# Altium footprint library THT_CON.PcbLib: 48 footprints (part 2 of 3)
Each footprint in its own frame and in the unit in brackets; x right, y up, seen from the top. Pads: shape width x height; smd on the part's side, far side on the other; paste and mask are expansions set on the pad; w line width, h text height; cw(c..) or ccw(c..) is an arc to the next point about the centre after c.
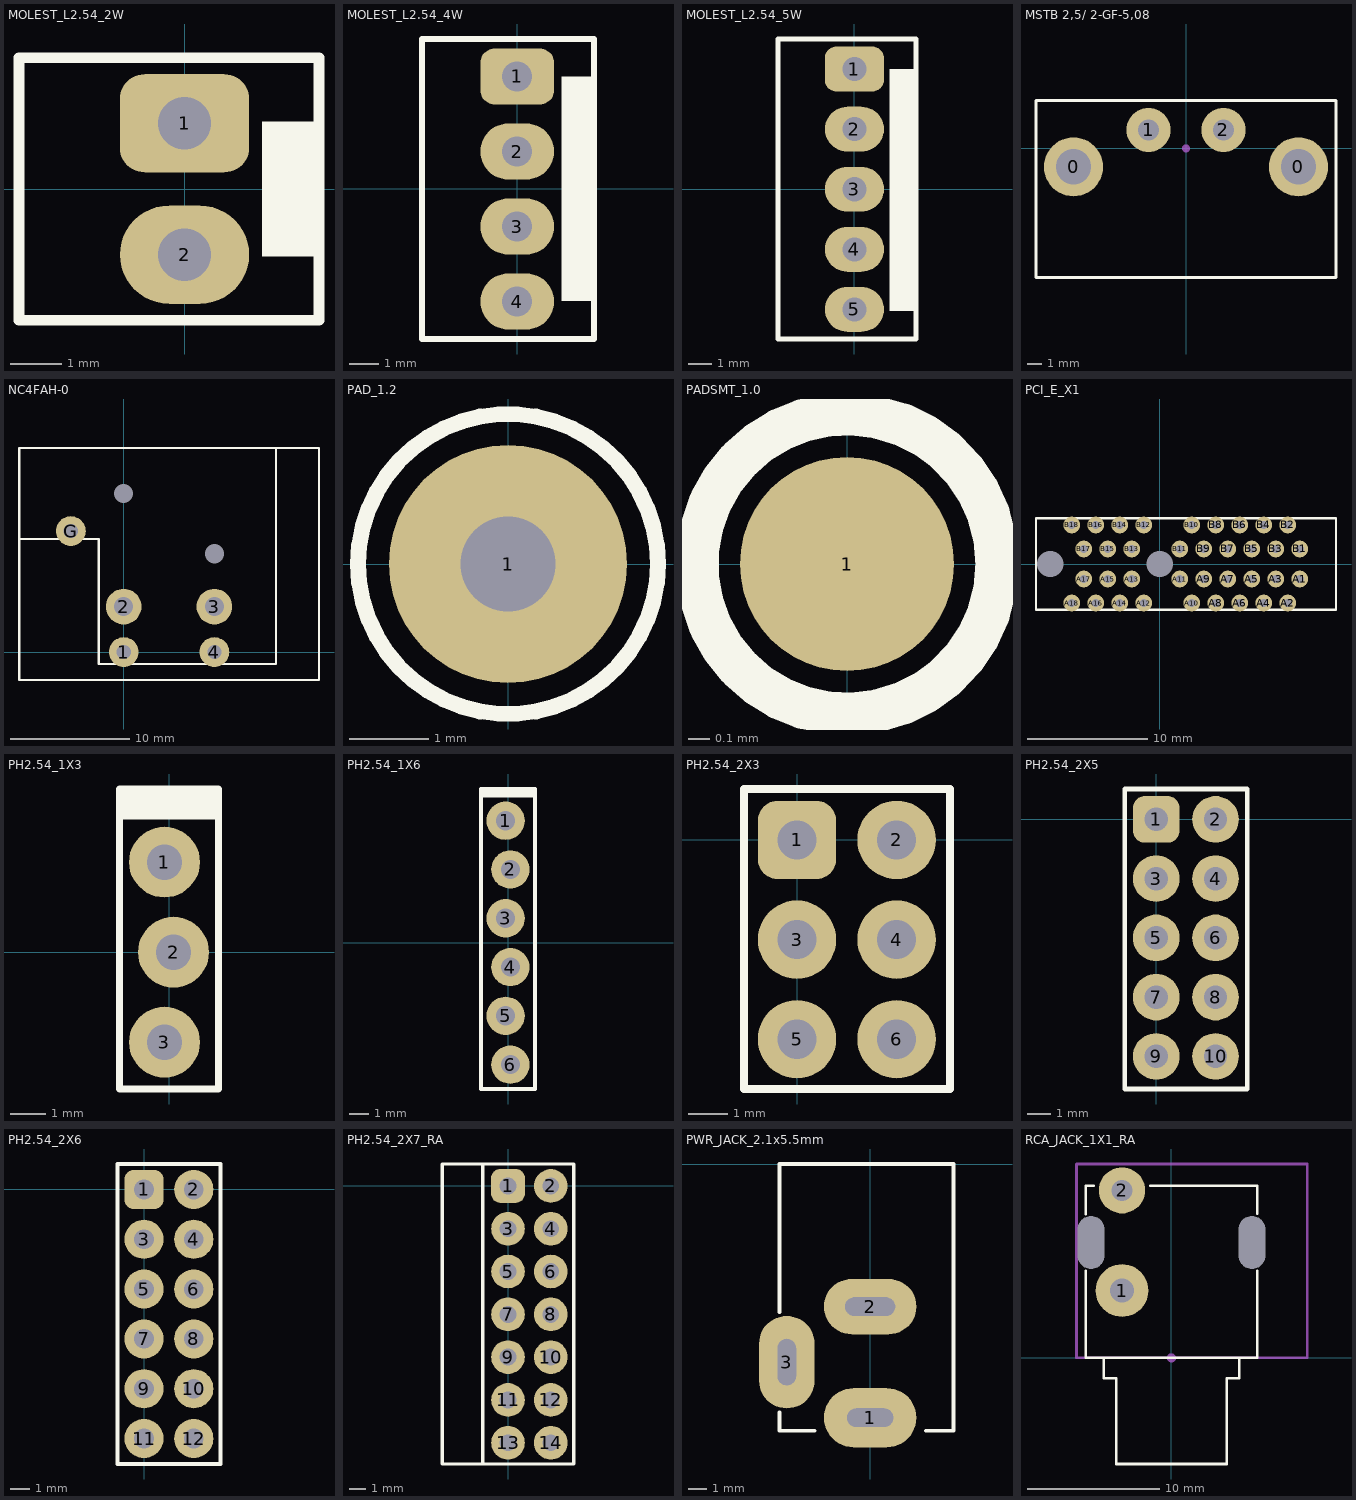
[diagram p1: the footprints below, top view; thin cyan lines are the x and y axes]

## MOLEST_L2.54_2W [mm]
pads (2):
  rrect50% 2.5x1.9 hole 1.016: 1(0,1.27)
  oval 2.5x1.9 hole 1.016: 2(0,-1.27)
Top Overlay:
  region: 2.6,1.3 1.5,1.3 1.5,-1.3 2.6,-1.3
  lines w0.203: -3.2,-2.54 -3.2,2.54 2.6,2.54 2.6,-2.54 -3.2,-2.54
3D body "molex2pin.STEP": height 11.41, standoff -3.39, extent -3.2,-2.565 2.6,2.555

## MOLEST_L2.54_4W [mm]
pads (4):
  rrect50% 2.5x1.9 hole 1.016: 1(0,3.81)
  oval 2.5x1.9 hole 1.016: 2(0,1.27) 3(0,-1.27) 4(0,-3.81)
Top Overlay:
  region: 2.6,3.81 1.5,3.81 1.5,-3.79 2.6,-3.79
  lines w0.203: 1.245,-5.08 -3.225,-5.08 -3.225,5.08 2.6,5.08 2.6,-5.08 -1.27,-5.08 1.27,-5.08
3D body "molex4pin.STEP": height 11.44, standoff -3.36, extent -3.2,-5.09 2.6,5.11

## MOLEST_L2.54_5W [mm]
pads (5):
  rrect50% 2.5x1.9 hole 1.016: 1(0,5.08)
  oval 2.5x1.9 hole 1.016: 2(0,2.54) 3(0,0) 4(0,-2.54) 5(0,-5.08)
Top Overlay:
  region: 2.6,5.08 1.5,5.08 1.5,-5.13 2.6,-5.13
  lines w0.203: -3.225,-6.33 2.6,-6.33 2.6,6.35 -3.225,6.35 -3.225,-6.33
3D body "molex4pin.STEP": height 11.44, standoff -3.36, extent -3.2,-6.36 2.6,3.84
3D body "molex4pin.STEP": height 11.44, standoff -3.36, extent -3.2,-3.82 2.6,6.38

## MSTB 2,5/ 2-GF-5,08 [mm] "Phoenix 2 pin 5.08mm"
pads (4):
  round 4 hole 2.4: 0(-7.62,-1.25) 0(7.62,-1.25)
  round 3 hole 1.4: 1(-2.54,1.25) 2(2.54,1.25)
Top Overlay:
  lines w0.2: -10.16,-8.75 10.16,-8.75 10.16,3.25 -10.16,3.25 -10.16,-8.75
Mechanical 15:
  circle w0.254: c0,0 r0.141
3D body "pxc_1776508_06_03_MSTB-2-5-2-GF-5-08_3D.stp": height 8.57, standoff -3.5, extent -10.135,-8.794 10.135,3.206

## NC4FAH-0 [mm]
pads (7):
  round 0 hole 1.6 unplated: 0(0,13.34) 0(7.62,8.26)
  round 2.5 hole 1.2: 1(0,0) 4(7.62,0) G(-4.44,10.17)
  round 3 hole 1.6: 2(0,3.815) 3(7.62,3.815)
Top Overlay:
  lines w0.2: -8.8,9.5 -2.1,9.5 -2.1,-1 12.8,-1 12.8,17.1 ; -8.79,-2.35 -8.79,17.15 16.41,17.15 16.41,-2.35 -8.79,-2.35
3D body "nc4fah-0.STEP": height 25, standoff -3.51, extent -8.69,-2.35 16.31,20.05

## PAD_1.2 [mm]
pads (1):
  round 3 hole 1.2: 1(0,0)
Top Overlay:
  circle w0.2: c0,0 r1.887

## PADSMT_1.0 [mm]
pads (1):
  round 1 smd: 1(0,0)
Top Overlay:
  circle w0.2: c0,0 r0.7

## PCI_E_X1 [mm]
pads (38):
  round 1.4 / inner round 1.1 / far side round 1.4 hole 0.7: A1(11.662,-1.25) A2(10.662,-3.25) A3(9.662,-1.25) A4(8.662,-3.25) A5(7.662,-1.25) A6(6.662,-3.25) A7(5.662,-1.25) A8(4.662,-3.25) A9(3.662,-1.25) A10(2.662,-3.25) A11(1.662,-1.25) A12(-1.338,-3.25) A13(-2.338,-1.25) A14(-3.338,-3.25) A15(-4.338,-1.25) A16(-5.338,-3.25) A17(-6.338,-1.25) A18(-7.338,-3.25) B1(11.662,1.25) B2(10.662,3.25) B3(9.662,1.25) B4(8.662,3.25) B5(7.662,1.25) B6(6.662,3.25) B7(5.662,1.25) B8(4.662,3.25) B9(3.662,1.25) B10(2.662,3.25) B11(1.662,1.25) B12(-1.338,3.25) B13(-2.338,1.25) B14(-3.338,3.25) B15(-4.338,1.25) B16(-5.338,3.25) B17(-6.338,1.25) B18(-7.338,3.25)
  round 1 hole 2.2 unplated mask+0.675: MECH1(-9.125,0) MECH2(0,0)
Top Overlay:
  lines w0.2: -10.325,-3.8 14.675,-3.8 14.675,3.8 -10.325,3.8 -10.325,-3.8
Mechanical 8:
  lines w0.1: -7.838,-3.25 -7.338,-3.25 ; -7.838,3.25 -7.338,3.25 ; -7.338,-3.75 -7.338,-3.25 ; -7.338,-2.75 -7.338,-3.25 ; -7.338,2.75 -7.338,3.25 ; -7.338,3.75 -7.338,3.25 ; -6.838,-3.25 -7.338,-3.25 ; -6.838,-1.25 -6.338,-1.25 ; -6.838,1.25 -6.338,1.25 ; -6.838,3.25 -7.338,3.25 ; -6.338,-1.75 -6.338,-1.25 ; -6.338,-0.75 -6.338,-1.25 ; -6.338,0.75 -6.338,1.25 ; -6.338,1.75 -6.338,1.25 ; -5.838,-3.25 -5.338,-3.25 ; -5.838,-1.25 -6.338,-1.25 ; -5.838,1.25 -6.338,1.25 ; -5.838,3.25 -5.338,3.25 ; -5.338,-3.75 -5.338,-3.25 ; -5.338,-2.75 -5.338,-3.25 ; -5.338,2.75 -5.338,3.25 ; -5.338,3.75 -5.338,3.25 ; -4.838,-3.25 -5.338,-3.25 ; -4.838,-1.25 -4.338,-1.25 ; -4.838,1.25 -4.338,1.25 ; -4.838,3.25 -5.338,3.25 ; -4.338,-1.75 -4.338,-1.25 ; -4.338,-0.75 -4.338,-1.25 ; -4.338,0.75 -4.338,1.25 ; -4.338,1.75 -4.338,1.25 ; -3.838,-3.25 -3.338,-3.25 ; -3.838,-1.25 -4.338,-1.25 ; -3.838,1.25 -4.338,1.25 ; -3.838,3.25 -3.338,3.25 ; -3.338,-3.75 -3.338,-3.25 ; -3.338,-2.75 -3.338,-3.25 ; -3.338,2.75 -3.338,3.25 ; -3.338,3.75 -3.338,3.25 ; -2.838,-3.25 -3.338,-3.25 ; -2.838,-1.25 -2.338,-1.25 ; -2.838,1.25 -2.338,1.25 ; -2.838,3.25 -3.338,3.25 ; -2.338,-1.75 -2.338,-1.25 ; -2.338,-0.75 -2.338,-1.25 ; -2.338,0.75 -2.338,1.25 ; -2.338,1.75 -2.338,1.25 ; -1.838,-3.25 -1.338,-3.25 ; -1.838,-1.25 -2.338,-1.25 ; -1.838,1.25 -2.338,1.25 ; -1.838,3.25 -1.338,3.25 ; -1.338,-3.75 -1.338,-3.25 ; -1.338,-2.75 -1.338,-3.25 ; -1.338,2.75 -1.338,3.25 ; -1.338,3.75 -1.338,3.25 ; -0.838,-3.25 -1.338,-3.25 ; -0.838,3.25 -1.338,3.25 ; 1.162,-1.25 1.662,-1.25 ; 1.162,1.25 1.662,1.25 ; 1.662,-1.75 1.662,-1.25 ; 1.662,-0.75 1.662,-1.25 ; 1.662,0.75 1.662,1.25 ; 1.662,1.75 1.662,1.25 ; 2.162,-3.25 2.662,-3.25 ; 2.162,-1.25 1.662,-1.25 ; 2.162,1.25 1.662,1.25 ; 2.162,3.25 2.662,3.25 ; 2.662,-3.75 2.662,-3.25 ; 2.662,-2.75 2.662,-3.25 ; 2.662,2.75 2.662,3.25 ; 2.662,3.75 2.662,3.25 ; 3.162,-3.25 2.662,-3.25 ; 3.162,-1.25 3.662,-1.25 ; 3.162,1.25 3.662,1.25 ; 3.162,3.25 2.662,3.25 ; 3.662,-1.75 3.662,-1.25 ; 3.662,-0.75 3.662,-1.25 ; 3.662,0.75 3.662,1.25 ; 3.662,1.75 3.662,1.25 ; 4.162,-3.25 4.662,-3.25 ; 4.162,-1.25 3.662,-1.25 ; 4.162,1.25 3.662,1.25 ; 4.162,3.25 4.662,3.25 ; 4.662,-3.75 4.662,-3.25 ; 4.662,-2.75 4.662,-3.25 ; 4.662,2.75 4.662,3.25 ; 4.662,3.75 4.662,3.25 ; 5.162,-3.25 4.662,-3.25 ; 5.162,-1.25 5.662,-1.25 ; 5.162,1.25 5.662,1.25 ; 5.162,3.25 4.662,3.25 ; 5.662,-1.75 5.662,-1.25 ; 5.662,-0.75 5.662,-1.25 ; 5.662,0.75 5.662,1.25 ; 5.662,1.75 5.662,1.25 ; 6.162,-3.25 6.662,-3.25 ; 6.162,-1.25 5.662,-1.25 ; 6.162,1.25 5.662,1.25 ; 6.162,3.25 6.662,3.25 ; 6.662,-3.75 6.662,-3.25 ; 6.662,-2.75 6.662,-3.25 ; 6.662,2.75 6.662,3.25 ; 6.662,3.75 6.662,3.25 ; 7.162,-3.25 6.662,-3.25 ; 7.162,-1.25 7.662,-1.25 ; 7.162,1.25 7.662,1.25 ; 7.162,3.25 6.662,3.25 ; 7.662,-1.75 7.662,-1.25 ; 7.662,-0.75 7.662,-1.25 ; 7.662,0.75 7.662,1.25 ; 7.662,1.75 7.662,1.25 ; 8.162,-3.25 8.662,-3.25 ; 8.162,-1.25 7.662,-1.25 ; 8.162,1.25 7.662,1.25 ; 8.162,3.25 8.662,3.25 ; 8.662,-3.75 8.662,-3.25 ; 8.662,-2.75 8.662,-3.25 ; 8.662,2.75 8.662,3.25 ; 8.662,3.75 8.662,3.25 ; 9.162,-3.25 8.662,-3.25 ; 9.162,-1.25 9.662,-1.25 ; 9.162,1.25 9.662,1.25 ; 9.162,3.25 8.662,3.25 ; 9.662,-1.75 9.662,-1.25 ; 9.662,-0.75 9.662,-1.25 ; 9.662,0.75 9.662,1.25 ; 9.662,1.75 9.662,1.25 ; 10.162,-3.25 10.662,-3.25 ; 10.162,-1.25 9.662,-1.25 ; 10.162,1.25 9.662,1.25 ; 10.162,3.25 10.662,3.25 ; 10.662,-3.75 10.662,-3.25 ; 10.662,-2.75 10.662,-3.25 ; 10.662,2.75 10.662,3.25 ; 10.662,3.75 10.662,3.25 ; 11.162,-3.25 10.662,-3.25 ; 11.162,-1.25 11.662,-1.25 ; 11.162,1.25 11.662,1.25 ; 11.162,3.25 10.662,3.25 ; 11.662,-1.75 11.662,-1.25 ; 11.662,-0.75 11.662,-1.25 ; 11.662,0.75 11.662,1.25 ; 11.662,1.75 11.662,1.25 ; 12.162,-1.25 11.662,-1.25 ; 12.162,1.25 11.662,1.25
3D body "1871058-1.stp": height 11, standoff -4.4, extent -10.338,-3.75 14.662,5.1

## PH2.54_1X3 [mm] "https://www.3dcontentcentral.com/secure/download-model.aspx?catalogid=171&id=227431"
pads (3):
  round 2 hole 1: 1(-0.127,2.54) 2(0.127,0) 3(-0.127,-2.54)
Top Overlay:
  rectangle: -1.4,3.8 1.4,4.6
  lines w0.2: -1.4,3.8 -1.4,4.6 1.4,4.6 1.4,3.7 ; -1.4,-3.86 -1.4,3.84 -1.1,3.84 1.4,3.84 1.4,-3.86 -1.4,-3.86
3D body "User Library-1x3 TH Pitch 2_54mm.step": height 9.5, standoff -3.2, extent -1.275,-3.82 1.265,3.8

## PH2.54_1X6 [mm] "https://www.3dcontentcentral.com/secure/download-model.aspx?catalogid=171&id=227431"
pads (6):
  round 2 hole 1: 1(-0.127,6.35) 2(0.127,3.81) 3(-0.127,1.27) 4(0.127,-1.27) 5(-0.127,-3.81) 6(0.127,-6.35)
Top Overlay:
  rectangle: -1.4,7.61 1.4,8
  lines w0.2: -1.4,7.61 -1.4,8 1.4,8 1.4,7.51 ; -1.4,-7.62 -1.4,7.65 -1.1,7.65 1.4,7.65 1.4,-7.62 -1.4,-7.62
3D body "User Library-Header_Male_6Pin.STEP": height 8.54, standoff -3, extent -1.25,-7.63 1.24,7.61

## PH2.54_2X3 [mm] "https://www.3dcontentcentral.com/secure/download-model.aspx?catalogid=171&id=227431"
pads (6):
  rrect50% 2x2 hole 1: 1(0,0)
  round 2 hole 1: 2(2.54,0) 3(0,-2.54) 4(2.54,-2.54) 5(0,-5.08) 6(2.54,-5.08)
Top Overlay:
  lines w0.2: -1.35,-6.35 -1.35,1.3 -1.1,1.3 3.9,1.3 3.9,-6.35 -1.35,-6.35
3D body "User Library-PLD-2x3.step": height 8.4, standoff -3, extent -1.23,-6.35 3.77,1.27

## PH2.54_2X5 [mm] "https://www.3dcontentcentral.com/secure/download-model.aspx?catalogid=171&id=227431"
pads (10):
  rrect50% 2x2 hole 1: 1(0,0)
  round 2 hole 1: 2(2.54,0) 3(0,-2.54) 4(2.54,-2.54) 5(0,-5.08) 6(2.54,-5.08) 7(0,-7.62) 8(2.54,-7.62) 9(0,-10.16) 10(2.54,-10.16)
Top Overlay:
  lines w0.2: -1.35,-11.557 -1.35,1.3 -1.1,1.3 3.9,1.3 3.9,-11.557 -1.35,-11.557
3D body "User Library-PLD-2x5.step": height 8.4, standoff -3, extent -1.215,-11.43 3.785,1.27

## PH2.54_2X6 [mm] "https://www.3dcontentcentral.com/secure/download-model.aspx?catalogid=171&id=227431"
pads (12):
  rrect50% 2x2 hole 1: 1(0,0)
  round 2 hole 1: 2(2.54,0) 3(0,-2.54) 4(2.54,-2.54) 5(0,-5.08) 6(2.54,-5.08) 7(0,-7.62) 8(2.54,-7.62) 9(0,-10.16) 10(2.54,-10.16) 11(0,-12.7) 12(2.54,-12.7)
Top Overlay:
  lines w0.2: -1.35,-14 -1.35,1.3 -1.1,1.3 3.9,1.3 3.9,-14 -1.35,-14
3D body "User Library-PLD-xx.step": height 8.4, standoff -3, extent -1.225,-13.97 3.775,1.27

## PH2.54_2X7_RA [mm]
pads (14):
  rrect50% 2x2 hole 1: 1(0,0)
  round 2 hole 1: 2(2.54,0) 3(0,-2.54) 4(2.54,-2.54) 5(0,-5.08) 6(2.54,-5.08) 7(0,-7.62) 8(2.54,-7.62) 9(0,-10.16) 10(2.54,-10.16) 11(0,-12.7) 12(2.54,-12.7) 13(0,-15.24) 14(2.54,-15.24)
Top Overlay:
  lines w0.2: -1.5,-16.5 3.9,-16.5 3.9,1.3 -1.1,1.3 -1.5,1.3 ; -1.5,-16.5 -1.5,1.3 ; -1.5,-16.5 -3.9,-16.5 -3.9,1.3 -1.5,1.3
3D body "ph_2x7.STEP": height 5.11, standoff -2.74, extent -9.61,-16.51 2.86,1.27

## PWR_JACK_2.1x5.5mm [mm] "Power Connector, 2.1mm ID, 5.5mm OD"
height 11
pads (3):
  oval 5x3.2 hole 1 slot 2.5 at 0 deg: 1(0,-13.7)
  oval 5x3 hole 1 slot 2.7 at 0 deg: 2(0,-7.7)
  oval 3x5 hole 1 slot 2.5 at 90 deg: 3(-4.5,-10.7)
Top Overlay:
  lines w0.2: -4.9,-13.4 -4.9,-14.4 -3,-14.4 ; -4.9,-8 -4.9,0 4.5,0 4.5,-14.4 3,-14.4
3D body "User Library-PJ-002AH.STEP": height 11.05, standoff -3.45, extent -4.925,-14.4 4.475,0

## RCA_JACK_1X1_RA [mm]
pads (4):
  round 4 hole 1.8: 1(-3.75,5.1)
  round 3.5 hole 1.6: 2(-3.75,12.7)
  round 0 hole 2 slot 4 at 90 deg unplated: 34(-6.1,8.75) 34(6.1,8.75)
Top Overlay:
  lines w0.2: -6.5,6.6 -6.5,0 6.5,0 6.5,6.6 ; -6.5,10.9 -6.5,13.05 -5.9,13.05 ; -5.15,-0.05 -5.15,-1.55 -4.192,-1.55 -4.192,-8.05 4.192,-8.05 4.192,-1.55 5.15,-1.55 5.15,-0.05 ; -1.6,13.05 6.5,13.05 6.5,10.95
Mechanical 15:
  circle w0.4: c0,0 r0.141
  lines w0.2: -7.2,0 10.3,0 10.3,13.45 10.3,14.7 -6.25,14.7 -7.2,14.7 -7.2,0
3D body "pjras1x1s_series.STEP": height 18.48, standoff -4.67, extent -6.5,-8.154 9.995,13.05